# Altium schematic symbol library SCHLIB.SchLib: 2608 symbols (part 17 of 20) (continued)
## R-158K-0402 (continued)
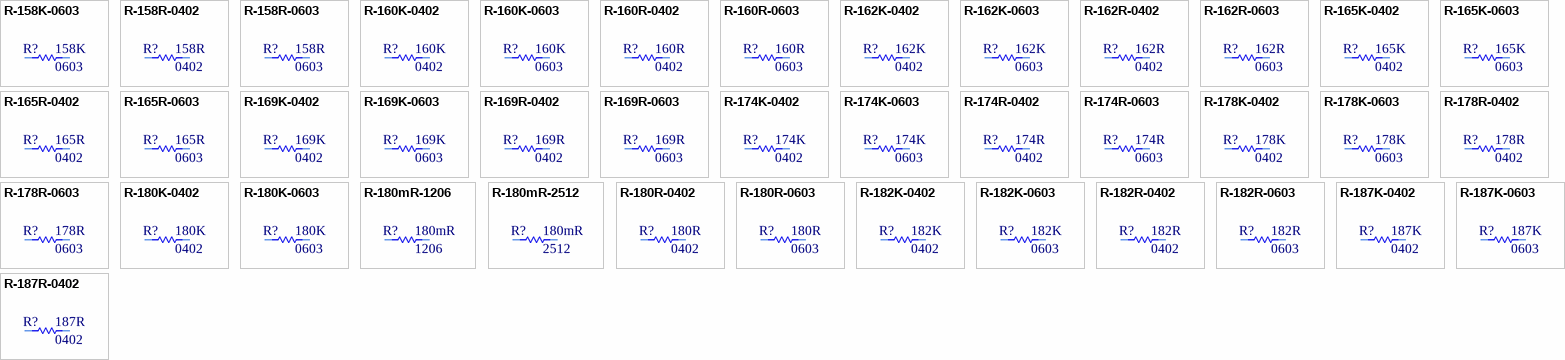
[diagram p72: symbols R-158K-0603 to R-187R-0402]

## R-158K-0603
designator R?, comment Package: 0603  (hidden comment: 158K)
RES SMD 158K OHM 1% 1/10W 0603; Manufacturer Part Number: CRCW0603158KFKEA; Manufacturer: Vishay Dale; Tolerance: 0.01; Power: 0.1W; Temperature Coefficient: ±100ppm/°C; Object  Type: Part; Design Item ID: R-158K-0603; Value: 158K; Composition: Thick Film; Features: Automotive AEC-Q200; Operating Temperature: -55°C ~ 155°C; Height - Seated (Max): 0.50mm; Category: Resistor
footprint R0603
pins: 1, 2

## R-158R-0402
designator R?, comment Package: 0402  (hidden comment: 158R)
RES 158 OHM 1% 1/16W 0402; Manufacturer Part Number: RC0402FR-07158RL; Manufacturer: YAGEO; Tolerance: 0.01; Power: 0.063W; Temperature Coefficient: ±100ppm/°C; Object  Type: Part; Design Item ID: R-158R-0402; Value: 158R; Composition: Thick Film; Features: Moisture Resistant; Operating Temperature: -55°C ~ 155°C; Height - Seated (Max): 0.40mm; Category: Resistor
footprint R0402
pins: 1, 2

## R-158R-0603
designator R?, comment Package: 0603  (hidden comment: 158R)
RES SMD 158 OHM 1% 1/10W 0603; Manufacturer Part Number: CRCW0603158RFKEA; Manufacturer: Vishay Dale; Tolerance: 0.01; Power: 0.1W; Temperature Coefficient: ±100ppm/°C; Object  Type: Part; Design Item ID: R-158R-0603; Value: 158R; Composition: Thick Film; Features: Automotive AEC-Q200; Operating Temperature: -55°C ~ 155°C; Height - Seated (Max): 0.50mm; Category: Resistor
footprint R0603
pins: 1, 2

## R-160K-0402
designator R?, comment Package: 0402  (hidden comment: 160K)
RES 160K OHM 1% 1/16W 0402; Manufacturer Part Number: RC0402FR-07160KL; Manufacturer: YAGEO; Tolerance: 0.01; Power: 0.063W; Temperature Coefficient: ±100ppm/°C; Object  Type: Part; Design Item ID: R-160K-0402; Value: 160K; Composition: Thick Film; Features: Moisture Resistant; Operating Temperature: -55°C ~ 155°C; Height - Seated (Max): 0.40mm; Category: Resistor
footprint R0402
pins: 1, 2

## R-160K-0603
designator R?, comment Package: 0603  (hidden comment: 160K)
RES SMD 160K OHM 1% 1/10W 0603; Manufacturer Part Number: CRCW0603160KFKEA; Manufacturer: Vishay Dale; Tolerance: 0.01; Power: 0.1W; Temperature Coefficient: ±100ppm/°C; Object  Type: Part; Design Item ID: R-160K-0603; Value: 160K; Composition: Thick Film; Features: Automotive AEC-Q200; Operating Temperature: -55°C ~ 155°C; Height - Seated (Max): 0.50mm; Category: Resistor
footprint R0603
pins: 1, 2

## R-160R-0402
designator R?, comment Package: 0402  (hidden comment: 160R)
RES 160 OHM 1% 1/16W 0402; Manufacturer Part Number: RC0402FR-07160RL; Manufacturer: YAGEO; Tolerance: 0.01; Power: 0.063W; Temperature Coefficient: ±100ppm/°C; Object  Type: Part; Design Item ID: R-160R-0402; Value: 160R; Composition: Thick Film; Features: Moisture Resistant; Operating Temperature: -55°C ~ 155°C; Height - Seated (Max): 0.40mm; Category: Resistor
footprint R0402
pins: 1, 2

## R-160R-0603
designator R?, comment Package: 0603  (hidden comment: 160R)
RES SMD 160 OHM 1% 1/10W 0603; Manufacturer Part Number: CRCW0603160RFKEA; Manufacturer: Vishay Dale; Tolerance: 0.01; Power: 0.1W; Temperature Coefficient: ±100ppm/°C; Object  Type: Part; Design Item ID: R-160R-0603; Value: 160R; Composition: Thick Film; Features: Automotive AEC-Q200; Operating Temperature: -55°C ~ 155°C; Height - Seated (Max): 0.50mm; Category: Resistor
footprint R0603
pins: 1, 2

## R-162K-0402
designator R?, comment Package: 0402  (hidden comment: 162K)
RES 162K OHM 1% 1/16W 0402; Manufacturer Part Number: RC0402FR-07162KL; Manufacturer: YAGEO; Tolerance: 0.01; Power: 0.063W; Temperature Coefficient: ±100ppm/°C; Object  Type: Part; Design Item ID: R-162K-0402; Value: 162K; Composition: Thick Film; Features: Moisture Resistant; Operating Temperature: -55°C ~ 155°C; Height - Seated (Max): 0.40mm; Category: Resistor
footprint R0402
pins: 1, 2

## R-162K-0603
designator R?, comment Package: 0603  (hidden comment: 162K)
RES SMD 162K OHM 1% 1/10W 0603; Manufacturer Part Number: CRCW0603162KFKEA; Manufacturer: Vishay Dale; Tolerance: 0.01; Power: 0.1W; Temperature Coefficient: ±100ppm/°C; Object  Type: Part; Design Item ID: R-162K-0603; Value: 162K; Composition: Thick Film; Features: Automotive AEC-Q200; Operating Temperature: -55°C ~ 155°C; Height - Seated (Max): 0.50mm; Category: Resistor
footprint R0603
pins: 1, 2

## R-162R-0402
designator R?, comment Package: 0402  (hidden comment: 162R)
RES 162 OHM 1% 1/16W 0402; Manufacturer Part Number: RC0402FR-07162RL; Manufacturer: YAGEO; Tolerance: 0.01; Power: 0.063W; Temperature Coefficient: ±100ppm/°C; Object  Type: Part; Design Item ID: R-162R-0402; Value: 162R; Composition: Thick Film; Features: Moisture Resistant; Operating Temperature: -55°C ~ 155°C; Height - Seated (Max): 0.40mm; Category: Resistor
footprint R0402
pins: 1, 2

## R-162R-0603
designator R?, comment Package: 0603  (hidden comment: 162R)
RES SMD 162 OHM 1% 1/10W 0603; Manufacturer Part Number: CRCW0603162RFKEA; Manufacturer: Vishay Dale; Tolerance: 0.01; Power: 0.1W; Temperature Coefficient: ±100ppm/°C; Object  Type: Part; Design Item ID: R-162R-0603; Value: 162R; Composition: Thick Film; Features: Automotive AEC-Q200; Operating Temperature: -55°C ~ 155°C; Height - Seated (Max): 0.50mm; Category: Resistor
footprint R0603
pins: 1, 2

## R-165K-0402
designator R?, comment Package: 0402  (hidden comment: 165K)
RES 165K OHM 1% 1/16W 0402; Manufacturer Part Number: RC0402FR-07165KL; Manufacturer: YAGEO; Tolerance: 0.01; Power: 0.063W; Temperature Coefficient: ±100ppm/°C; Object  Type: Part; Design Item ID: R-165K-0402; Value: 165K; Composition: Thick Film; Features: Moisture Resistant; Operating Temperature: -55°C ~ 155°C; Height - Seated (Max): 0.40mm; Category: Resistor
footprint R0402
pins: 1, 2

## R-165K-0603
designator R?, comment Package: 0603  (hidden comment: 165K)
RES SMD 165K OHM 1% 1/10W 0603; Manufacturer Part Number: CRCW0603165KFKEA; Manufacturer: Vishay Dale; Tolerance: 0.01; Power: 0.1W; Temperature Coefficient: ±100ppm/°C; Object  Type: Part; Design Item ID: R-165K-0603; Value: 165K; Composition: Thick Film; Features: Automotive AEC-Q200; Operating Temperature: -55°C ~ 155°C; Height - Seated (Max): 0.50mm; Category: Resistor
footprint R0603
pins: 1, 2

## R-165R-0402
designator R?, comment Package: 0402  (hidden comment: 165R)
RES 165 OHM 1% 1/16W 0402; Manufacturer Part Number: RC0402FR-07165RL; Manufacturer: YAGEO; Tolerance: 0.01; Power: 0.063W; Temperature Coefficient: ±100ppm/°C; Object  Type: Part; Design Item ID: R-165R-0402; Value: 165R; Composition: Thick Film; Features: Moisture Resistant; Operating Temperature: -55°C ~ 155°C; Height - Seated (Max): 0.40mm; Category: Resistor
footprint R0402
pins: 1, 2

## R-165R-0603
designator R?, comment Package: 0603  (hidden comment: 165R)
RES SMD 165 OHM 1% 1/10W 0603; Manufacturer Part Number: CRCW0603165RFKEA; Manufacturer: Vishay Dale; Tolerance: 0.01; Power: 0.1W; Temperature Coefficient: ±100ppm/°C; Object  Type: Part; Design Item ID: R-165R-0603; Value: 165R; Composition: Thick Film; Features: Automotive AEC-Q200; Operating Temperature: -55°C ~ 155°C; Height - Seated (Max): 0.50mm; Category: Resistor
footprint R0603
pins: 1, 2

## R-169K-0402
designator R?, comment Package: 0402  (hidden comment: 169K)
RES 169K OHM 1% 1/16W 0402; Manufacturer Part Number: RC0402FR-07169KL; Manufacturer: YAGEO; Tolerance: 0.01; Power: 0.063W; Temperature Coefficient: ±100ppm/°C; Object  Type: Part; Design Item ID: R-169K-0402; Value: 169K; Composition: Thick Film; Features: Moisture Resistant; Operating Temperature: -55°C ~ 155°C; Height - Seated (Max): 0.40mm; Category: Resistor
footprint R0402
pins: 1, 2

## R-169K-0603
designator R?, comment Package: 0603  (hidden comment: 169K)
RES SMD 169K OHM 1% 1/10W 0603; Manufacturer Part Number: CRCW0603169KFKEA; Manufacturer: Vishay Dale; Tolerance: 0.01; Power: 0.1W; Temperature Coefficient: ±100ppm/°C; Object  Type: Part; Design Item ID: R-169K-0603; Value: 169K; Composition: Thick Film; Features: Automotive AEC-Q200; Operating Temperature: -55°C ~ 155°C; Height - Seated (Max): 0.50mm; Category: Resistor
footprint R0603
pins: 1, 2

## R-169R-0402
designator R?, comment Package: 0402  (hidden comment: 169R)
RES 169 OHM 1% 1/16W 0402; Manufacturer Part Number: RC0402FR-07169RL; Manufacturer: YAGEO; Tolerance: 0.01; Power: 0.063W; Temperature Coefficient: ±100ppm/°C; Object  Type: Part; Design Item ID: R-169R-0402; Value: 169R; Composition: Thick Film; Features: Moisture Resistant; Operating Temperature: -55°C ~ 155°C; Height - Seated (Max): 0.40mm; Category: Resistor
footprint R0402
pins: 1, 2

## R-169R-0603
designator R?, comment Package: 0603  (hidden comment: 169R)
RES SMD 169 OHM 1% 1/10W 0603; Manufacturer Part Number: CRCW0603169RFKEA; Manufacturer: Vishay Dale; Tolerance: 0.01; Power: 0.1W; Temperature Coefficient: ±100ppm/°C; Object  Type: Part; Design Item ID: R-169R-0603; Value: 169R; Composition: Thick Film; Features: Automotive AEC-Q200; Operating Temperature: -55°C ~ 155°C; Height - Seated (Max): 0.50mm; Category: Resistor
footprint R0603
pins: 1, 2

## R-174K-0402
designator R?, comment Package: 0402  (hidden comment: 174K)
RES 174K OHM 1% 1/16W 0402; Manufacturer Part Number: RC0402FR-07174KL; Manufacturer: YAGEO; Tolerance: 0.01; Power: 0.063W; Temperature Coefficient: ±100ppm/°C; Object  Type: Part; Design Item ID: R-174K-0402; Value: 174K; Composition: Thick Film; Features: Moisture Resistant; Operating Temperature: -55°C ~ 155°C; Height - Seated (Max): 0.40mm; Category: Resistor
footprint R0402
pins: 1, 2

## R-174K-0603
designator R?, comment Package: 0603  (hidden comment: 174K)
RES SMD 174K OHM 1% 1/10W 0603; Manufacturer Part Number: CRCW0603174KFKEA; Manufacturer: Vishay Dale; Tolerance: 0.01; Power: 0.1W; Temperature Coefficient: ±100ppm/°C; Object  Type: Part; Design Item ID: R-174K-0603; Value: 174K; Composition: Thick Film; Features: Automotive AEC-Q200; Operating Temperature: -55°C ~ 155°C; Height - Seated (Max): 0.50mm; Category: Resistor
footprint R0603
pins: 1, 2

## R-174R-0402
designator R?, comment Package: 0402  (hidden comment: 174R)
RES 174 OHM 1% 1/16W 0402; Manufacturer Part Number: RC0402FR-07174RL; Manufacturer: YAGEO; Tolerance: 0.01; Power: 0.063W; Temperature Coefficient: ±100ppm/°C; Object  Type: Part; Design Item ID: R-174R-0402; Value: 174R; Composition: Thick Film; Features: Moisture Resistant; Operating Temperature: -55°C ~ 155°C; Height - Seated (Max): 0.40mm; Category: Resistor
footprint R0402
pins: 1, 2

## R-174R-0603
designator R?, comment Package: 0603  (hidden comment: 174R)
RES SMD 174 OHM 1% 1/10W 0603; Manufacturer Part Number: CRCW0603174RFKEA; Manufacturer: Vishay Dale; Tolerance: 0.01; Power: 0.1W; Temperature Coefficient: ±100ppm/°C; Object  Type: Part; Design Item ID: R-174R-0603; Value: 174R; Composition: Thick Film; Features: Automotive AEC-Q200; Operating Temperature: -55°C ~ 155°C; Height - Seated (Max): 0.50mm; Category: Resistor
footprint R0603
pins: 1, 2

## R-178K-0402
designator R?, comment Package: 0402  (hidden comment: 178K)
RES 178K OHM 1% 1/16W 0402; Manufacturer Part Number: RC0402FR-07178KL; Manufacturer: YAGEO; Tolerance: 0.01; Power: 0.063W; Temperature Coefficient: ±100ppm/°C; Object  Type: Part; Design Item ID: R-178K-0402; Value: 178K; Composition: Thick Film; Features: Moisture Resistant; Operating Temperature: -55°C ~ 155°C; Height - Seated (Max): 0.40mm; Category: Resistor
footprint R0402
pins: 1, 2

## R-178K-0603
designator R?, comment Package: 0603  (hidden comment: 178K)
RES SMD 178K OHM 1% 1/10W 0603; Manufacturer Part Number: CRCW0603178KFKEA; Manufacturer: Vishay Dale; Tolerance: 0.01; Power: 0.1W; Temperature Coefficient: ±100ppm/°C; Object  Type: Part; Design Item ID: R-178K-0603; Value: 178K; Composition: Thick Film; Features: Automotive AEC-Q200; Operating Temperature: -55°C ~ 155°C; Height - Seated (Max): 0.50mm; Category: Resistor
footprint R0603
pins: 1, 2

## R-178R-0402
designator R?, comment Package: 0402  (hidden comment: 178R)
RES 178 OHM 1% 1/16W 0402; Manufacturer Part Number: RC0402FR-07178RL; Manufacturer: YAGEO; Tolerance: 0.01; Power: 0.063W; Temperature Coefficient: ±100ppm/°C; Object  Type: Part; Design Item ID: R-178R-0402; Value: 178R; Composition: Thick Film; Features: Moisture Resistant; Operating Temperature: -55°C ~ 155°C; Height - Seated (Max): 0.40mm; Category: Resistor
footprint R0402
pins: 1, 2

## R-178R-0603
designator R?, comment Package: 0603  (hidden comment: 178R)
RES SMD 178 OHM 1% 1/10W 0603; Manufacturer Part Number: CRCW0603178RFKEA; Manufacturer: Vishay Dale; Tolerance: 0.01; Power: 0.1W; Temperature Coefficient: ±100ppm/°C; Object  Type: Part; Design Item ID: R-178R-0603; Value: 178R; Composition: Thick Film; Features: Automotive AEC-Q200; Operating Temperature: -55°C ~ 155°C; Height - Seated (Max): 0.50mm; Category: Resistor
footprint R0603
pins: 1, 2

## R-180K-0402
designator R?, comment Package: 0402  (hidden comment: 180K)
RES 180K OHM 1% 1/16W 0402; Manufacturer Part Number: RC0402FR-07180KL; Manufacturer: YAGEO; Tolerance: 0.01; Power: 0.063W; Temperature Coefficient: ±100ppm/°C; Object  Type: Part; Design Item ID: R-180K-0402; Value: 180K; Composition: Thick Film; Features: Moisture Resistant; Operating Temperature: -55°C ~ 155°C; Height - Seated (Max): 0.40mm; Category: Resistor
footprint R0402
pins: 1, 2

## R-180K-0603
designator R?, comment Package: 0603  (hidden comment: 180K)
RES SMD 180K OHM 1% 1/10W 0603; Manufacturer Part Number: CRCW0603180KFKEA; Manufacturer: Vishay Dale; Tolerance: 0.01; Power: 0.1W; Temperature Coefficient: ±100ppm/°C; Object  Type: Part; Design Item ID: R-180K-0603; Value: 180K; Composition: Thick Film; Features: Automotive AEC-Q200; Operating Temperature: -55°C ~ 155°C; Height - Seated (Max): 0.50mm; Category: Resistor
footprint R0603
pins: 1, 2

## R-180mR-1206
designator R?, comment Package: 1206  (hidden comment: 180mR)
RES 0.18 OHM 1% 1/4W 1206; Manufacturer Part Number: WSL1206R1800FEA; Manufacturer: Vishay Dale; Tolerance: 0.01; Power: 0.25W; Temperature Coefficient: ±75ppm/°C; Object  Type: Part; Design Item ID: R-180mR-1206; Value: 180mR; Composition: Metal Element; Features: Anti-Sulfur, Automotive AEC-Q200, Current Sense, Moisture Resistant, Pulse Withstanding; Operating Temperature: -65°C ~ 170°C; Height - Seated (Max): 0.89mm; Category: Resistor
footprint R1206
pins: 1, 2

## R-180mR-2512
designator R?, comment Package: 2512  (hidden comment: 180mR)
RES 0.18 OHM 1% 1W 2512; Manufacturer Part Number: WSL2512R1800FEA; Manufacturer: Vishay Dale; Tolerance: 0.01; Temperature Coefficient: ±75ppm/°C; Object  Type: Part; Design Item ID: R-180mR-2512; Value: 180mR; Power: 1W; Composition: Metal Element; Features: Anti-Sulfur, Automotive AEC-Q200, Current Sense, Moisture Resistant, Pulse Withstanding; Operating Temperature: -65°C ~ 170°C; Height - Seated (Max): 0.89mm; Category: Resistor
footprint R2512
pins: 1, 2

## R-180R-0402
designator R?, comment Package: 0402  (hidden comment: 180R)
RES 180 OHM 1% 1/16W 0402; Manufacturer Part Number: RC0402FR-07180RL; Manufacturer: YAGEO; Tolerance: 0.01; Power: 0.063W; Temperature Coefficient: ±100ppm/°C; Object  Type: Part; Design Item ID: R-180R-0402; Value: 180R; Composition: Thick Film; Features: Moisture Resistant; Operating Temperature: -55°C ~ 155°C; Height - Seated (Max): 0.40mm; Category: Resistor
footprint R0402
pins: 1, 2

## R-180R-0603
designator R?, comment Package: 0603  (hidden comment: 180R)
RES SMD 180 OHM 1% 1/10W 0603; Manufacturer Part Number: CRCW0603180RFKEA; Manufacturer: Vishay Dale; Tolerance: 0.01; Power: 0.1W; Temperature Coefficient: ±100ppm/°C; Object  Type: Part; Design Item ID: R-180R-0603; Value: 180R; Composition: Thick Film; Features: Automotive AEC-Q200; Operating Temperature: -55°C ~ 155°C; Height - Seated (Max): 0.50mm; Category: Resistor
footprint R0603
pins: 1, 2

## R-182K-0402
designator R?, comment Package: 0402  (hidden comment: 182K)
RES 182K OHM 1% 1/16W 0402; Manufacturer Part Number: RC0402FR-07182KL; Manufacturer: YAGEO; Tolerance: 0.01; Power: 0.063W; Temperature Coefficient: ±100ppm/°C; Object  Type: Part; Design Item ID: R-182K-0402; Value: 182K; Composition: Thick Film; Features: Moisture Resistant; Operating Temperature: -55°C ~ 155°C; Height - Seated (Max): 0.40mm; Category: Resistor
footprint R0402
pins: 1, 2

## R-182K-0603
designator R?, comment Package: 0603  (hidden comment: 182K)
RES SMD 182K OHM 1% 1/10W 0603; Manufacturer Part Number: CRCW0603182KFKEA; Manufacturer: Vishay Dale; Tolerance: 0.01; Power: 0.1W; Temperature Coefficient: ±100ppm/°C; Object  Type: Part; Design Item ID: R-182K-0603; Value: 182K; Composition: Thick Film; Features: Automotive AEC-Q200; Operating Temperature: -55°C ~ 155°C; Height - Seated (Max): 0.50mm; Category: Resistor
footprint R0603
pins: 1, 2

## R-182R-0402
designator R?, comment Package: 0402  (hidden comment: 182R)
RES 182 OHM 1% 1/16W 0402; Manufacturer Part Number: RC0402FR-07182RL; Manufacturer: YAGEO; Tolerance: 0.01; Power: 0.063W; Temperature Coefficient: ±100ppm/°C; Object  Type: Part; Design Item ID: R-182R-0402; Value: 182R; Composition: Thick Film; Features: Moisture Resistant; Operating Temperature: -55°C ~ 155°C; Height - Seated (Max): 0.40mm; Category: Resistor
footprint R0402
pins: 1, 2

## R-182R-0603
designator R?, comment Package: 0603  (hidden comment: 182R)
RES SMD 182 OHM 1% 1/10W 0603; Manufacturer Part Number: CRCW0603182RFKEA; Manufacturer: Vishay Dale; Tolerance: 0.01; Power: 0.1W; Temperature Coefficient: ±100ppm/°C; Object  Type: Part; Design Item ID: R-182R-0603; Value: 182R; Composition: Thick Film; Features: Automotive AEC-Q200; Operating Temperature: -55°C ~ 155°C; Height - Seated (Max): 0.50mm; Category: Resistor
footprint R0603
pins: 1, 2

## R-187K-0402
designator R?, comment Package: 0402  (hidden comment: 187K)
RES 187K OHM 1% 1/16W 0402; Manufacturer Part Number: RC0402FR-07187KL; Manufacturer: YAGEO; Tolerance: 0.01; Power: 0.063W; Temperature Coefficient: ±100ppm/°C; Object  Type: Part; Design Item ID: R-187K-0402; Value: 187K; Composition: Thick Film; Features: Moisture Resistant; Operating Temperature: -55°C ~ 155°C; Height - Seated (Max): 0.40mm; Category: Resistor
footprint R0402
pins: 1, 2

## R-187K-0603
designator R?, comment Package: 0603  (hidden comment: 187K)
RES SMD 187K OHM 1% 1/10W 0603; Manufacturer Part Number: CRCW0603187KFKEA; Manufacturer: Vishay Dale; Tolerance: 0.01; Power: 0.1W; Temperature Coefficient: ±100ppm/°C; Object  Type: Part; Design Item ID: R-187K-0603; Value: 187K; Composition: Thick Film; Features: Automotive AEC-Q200; Operating Temperature: -55°C ~ 155°C; Height - Seated (Max): 0.50mm; Category: Resistor
footprint R0603
pins: 1, 2

## R-187R-0402
designator R?, comment Package: 0402  (hidden comment: 187R)
RES 187 OHM 1% 1/16W 0402; Manufacturer Part Number: RC0402FR-07187RL; Manufacturer: YAGEO; Tolerance: 0.01; Power: 0.063W; Temperature Coefficient: ±100ppm/°C; Object  Type: Part; Design Item ID: R-187R-0402; Value: 187R; Composition: Thick Film; Features: Moisture Resistant; Operating Temperature: -55°C ~ 155°C; Height - Seated (Max): 0.40mm; Category: Resistor
footprint R0402
pins: 1, 2

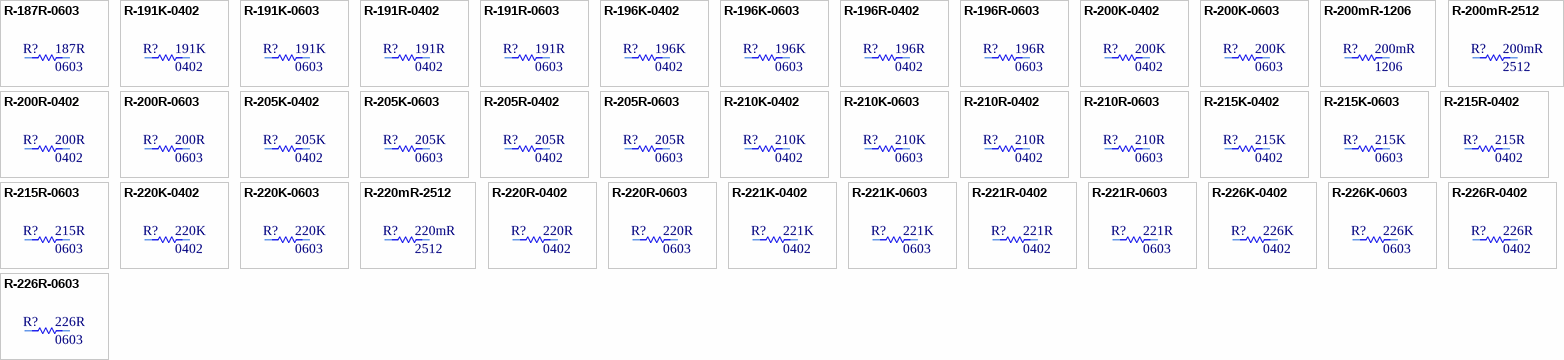
[diagram p73: symbols R-187R-0603 to R-226R-0603]

## R-187R-0603
designator R?, comment Package: 0603  (hidden comment: 187R)
RES SMD 187 OHM 1% 1/10W 0603; Manufacturer Part Number: CRCW0603187RFKEA; Manufacturer: Vishay Dale; Tolerance: 0.01; Power: 0.1W; Temperature Coefficient: ±100ppm/°C; Object  Type: Part; Design Item ID: R-187R-0603; Value: 187R; Composition: Thick Film; Features: Automotive AEC-Q200; Operating Temperature: -55°C ~ 155°C; Height - Seated (Max): 0.50mm; Category: Resistor
footprint R0603
pins: 1, 2

## R-191K-0402
designator R?, comment Package: 0402  (hidden comment: 191K)
RES 191K OHM 1% 1/16W 0402; Manufacturer Part Number: RC0402FR-07191KL; Manufacturer: YAGEO; Tolerance: 0.01; Power: 0.063W; Temperature Coefficient: ±100ppm/°C; Object  Type: Part; Design Item ID: R-191K-0402; Value: 191K; Composition: Thick Film; Features: Moisture Resistant; Operating Temperature: -55°C ~ 155°C; Height - Seated (Max): 0.40mm; Category: Resistor
footprint R0402
pins: 1, 2

## R-191K-0603
designator R?, comment Package: 0603  (hidden comment: 191K)
RES SMD 191K OHM 1% 1/10W 0603; Manufacturer Part Number: CRCW0603191KFKEA; Manufacturer: Vishay Dale; Tolerance: 0.01; Power: 0.1W; Temperature Coefficient: ±100ppm/°C; Object  Type: Part; Design Item ID: R-191K-0603; Value: 191K; Composition: Thick Film; Features: Automotive AEC-Q200; Operating Temperature: -55°C ~ 155°C; Height - Seated (Max): 0.50mm; Category: Resistor
footprint R0603
pins: 1, 2

## R-191R-0402
designator R?, comment Package: 0402  (hidden comment: 191R)
RES 191 OHM 1% 1/16W 0402; Manufacturer Part Number: RC0402FR-07191RL; Manufacturer: YAGEO; Tolerance: 0.01; Power: 0.063W; Temperature Coefficient: ±100ppm/°C; Object  Type: Part; Design Item ID: R-191R-0402; Value: 191R; Composition: Thick Film; Features: Moisture Resistant; Operating Temperature: -55°C ~ 155°C; Height - Seated (Max): 0.40mm; Category: Resistor
footprint R0402
pins: 1, 2

## R-191R-0603
designator R?, comment Package: 0603  (hidden comment: 191R)
RES SMD 191 OHM 1% 1/10W 0603; Manufacturer Part Number: CRCW0603191RFKEA; Manufacturer: Vishay Dale; Tolerance: 0.01; Power: 0.1W; Temperature Coefficient: ±100ppm/°C; Object  Type: Part; Design Item ID: R-191R-0603; Value: 191R; Composition: Thick Film; Features: Automotive AEC-Q200; Operating Temperature: -55°C ~ 155°C; Height - Seated (Max): 0.50mm; Category: Resistor
footprint R0603
pins: 1, 2

## R-196K-0402
designator R?, comment Package: 0402  (hidden comment: 196K)
RES 196K OHM 1% 1/16W 0402; Manufacturer Part Number: RC0402FR-07196KL; Manufacturer: YAGEO; Tolerance: 0.01; Power: 0.063W; Temperature Coefficient: ±100ppm/°C; Object  Type: Part; Design Item ID: R-196K-0402; Value: 196K; Composition: Thick Film; Features: Moisture Resistant; Operating Temperature: -55°C ~ 155°C; Height - Seated (Max): 0.40mm; Category: Resistor
footprint R0402
pins: 1, 2

## R-196K-0603
designator R?, comment Package: 0603  (hidden comment: 196K)
RES SMD 196K OHM 1% 1/10W 0603; Manufacturer Part Number: CRCW0603196KFKEA; Manufacturer: Vishay Dale; Tolerance: 0.01; Power: 0.1W; Temperature Coefficient: ±100ppm/°C; Object  Type: Part; Design Item ID: R-196K-0603; Value: 196K; Composition: Thick Film; Features: Automotive AEC-Q200; Operating Temperature: -55°C ~ 155°C; Height - Seated (Max): 0.50mm; Category: Resistor
footprint R0603
pins: 1, 2

## R-196R-0402
designator R?, comment Package: 0402  (hidden comment: 196R)
RES 196 OHM 1% 1/16W 0402; Manufacturer Part Number: RC0402FR-07196RL; Manufacturer: YAGEO; Tolerance: 0.01; Power: 0.063W; Temperature Coefficient: ±100ppm/°C; Object  Type: Part; Design Item ID: R-196R-0402; Value: 196R; Composition: Thick Film; Features: Moisture Resistant; Operating Temperature: -55°C ~ 155°C; Height - Seated (Max): 0.40mm; Category: Resistor
footprint R0402
pins: 1, 2

## R-196R-0603
designator R?, comment Package: 0603  (hidden comment: 196R)
RES SMD 196 OHM 1% 1/10W 0603; Manufacturer Part Number: CRCW0603196RFKEA; Manufacturer: Vishay Dale; Tolerance: 0.01; Power: 0.1W; Temperature Coefficient: ±100ppm/°C; Object  Type: Part; Design Item ID: R-196R-0603; Value: 196R; Composition: Thick Film; Features: Automotive AEC-Q200; Operating Temperature: -55°C ~ 155°C; Height - Seated (Max): 0.50mm; Category: Resistor
footprint R0603
pins: 1, 2

## R-200K-0402
designator R?, comment Package: 0402  (hidden comment: 200K)
RES 200K OHM 1% 1/16W 0402; Manufacturer Part Number: RC0402FR-07200KL; Manufacturer: YAGEO; Tolerance: 0.01; Power: 0.063W; Temperature Coefficient: ±100ppm/°C; Object  Type: Part; Design Item ID: R-200K-0402; Value: 200K; Composition: Thick Film; Features: Moisture Resistant; Operating Temperature: -55°C ~ 155°C; Height - Seated (Max): 0.40mm; Category: Resistor
footprint R0402
pins: 1, 2

## R-200K-0603
designator R?, comment Package: 0603  (hidden comment: 200K)
RES SMD 200K OHM 1% 1/10W 0603; Manufacturer Part Number: CRCW0603200KFKEA; Manufacturer: Vishay Dale; Tolerance: 0.01; Power: 0.1W; Temperature Coefficient: ±100ppm/°C; Object  Type: Part; Design Item ID: R-200K-0603; Value: 200K; Composition: Thick Film; Features: Automotive AEC-Q200; Operating Temperature: -55°C ~ 155°C; Height - Seated (Max): 0.50mm; Category: Resistor
footprint R0603
pins: 1, 2

## R-200mR-1206
designator R?, comment Package: 1206  (hidden comment: 200mR)
RES 0.2 OHM 1% 1/4W 1206; Manufacturer Part Number: WSL1206R2000FEA; Manufacturer: Vishay Dale; Tolerance: 0.01; Power: 0.25W; Temperature Coefficient: ±75ppm/°C; Object  Type: Part; Design Item ID: R-200mR-1206; Value: 200mR; Composition: Metal Element; Features: Anti-Sulfur, Automotive AEC-Q200, Current Sense, Moisture Resistant, Pulse Withstanding; Operating Temperature: -65°C ~ 170°C; Height - Seated (Max): 0.89mm; Category: Resistor
footprint R1206
pins: 1, 2

## R-200mR-2512
designator R?, comment Package: 2512  (hidden comment: 200mR)
RES 0.2 OHM 1% 1W 2512; Manufacturer Part Number: WSL2512R2000FEA; Manufacturer: Vishay Dale; Tolerance: 0.01; Temperature Coefficient: ±75ppm/°C; Object  Type: Part; Design Item ID: R-200mR-2512; Value: 200mR; Power: 1W; Composition: Metal Element; Features: Anti-Sulfur, Automotive AEC-Q200, Current Sense, Moisture Resistant, Pulse Withstanding; Operating Temperature: -65°C ~ 170°C; Height - Seated (Max): 0.89mm; Category: Resistor
footprint R2512
pins: 1, 2

## R-200R-0402
designator R?, comment Package: 0402  (hidden comment: 200R)
RES 200 OHM 1% 1/16W 0402; Manufacturer Part Number: RC0402FR-07200RL; Manufacturer: YAGEO; Tolerance: 0.01; Power: 0.063W; Temperature Coefficient: ±100ppm/°C; Object  Type: Part; Design Item ID: R-200R-0402; Value: 200R; Composition: Thick Film; Features: Moisture Resistant; Operating Temperature: -55°C ~ 155°C; Height - Seated (Max): 0.40mm; Category: Resistor
footprint R0402
pins: 1, 2

## R-200R-0603
designator R?, comment Package: 0603  (hidden comment: 200R)
RES SMD 200 OHM 1% 1/10W 0603; Manufacturer Part Number: CRCW0603200RFKEA; Manufacturer: Vishay Dale; Tolerance: 0.01; Power: 0.1W; Temperature Coefficient: ±100ppm/°C; Object  Type: Part; Design Item ID: R-200R-0603; Value: 200R; Composition: Thick Film; Features: Automotive AEC-Q200; Operating Temperature: -55°C ~ 155°C; Height - Seated (Max): 0.50mm; Category: Resistor
footprint R0603
pins: 1, 2

## R-205K-0402
designator R?, comment Package: 0402  (hidden comment: 205K)
RES 205K OHM 1% 1/16W 0402; Manufacturer Part Number: RC0402FR-07205KL; Manufacturer: YAGEO; Tolerance: 0.01; Power: 0.063W; Temperature Coefficient: ±100ppm/°C; Object  Type: Part; Design Item ID: R-205K-0402; Value: 205K; Composition: Thick Film; Features: Moisture Resistant; Operating Temperature: -55°C ~ 155°C; Height - Seated (Max): 0.40mm; Category: Resistor
footprint R0402
pins: 1, 2

## R-205K-0603
designator R?, comment Package: 0603  (hidden comment: 205K)
RES SMD 205K OHM 1% 1/10W 0603; Manufacturer Part Number: CRCW0603205KFKEA; Manufacturer: Vishay Dale; Tolerance: 0.01; Power: 0.1W; Temperature Coefficient: ±100ppm/°C; Object  Type: Part; Design Item ID: R-205K-0603; Value: 205K; Composition: Thick Film; Features: Automotive AEC-Q200; Operating Temperature: -55°C ~ 155°C; Height - Seated (Max): 0.50mm; Category: Resistor
footprint R0603
pins: 1, 2

## R-205R-0402
designator R?, comment Package: 0402  (hidden comment: 205R)
RES 205 OHM 1% 1/16W 0402; Manufacturer Part Number: RC0402FR-07205RL; Manufacturer: YAGEO; Tolerance: 0.01; Power: 0.063W; Temperature Coefficient: ±100ppm/°C; Object  Type: Part; Design Item ID: R-205R-0402; Value: 205R; Composition: Thick Film; Features: Moisture Resistant; Operating Temperature: -55°C ~ 155°C; Height - Seated (Max): 0.40mm; Category: Resistor
footprint R0402
pins: 1, 2

## R-205R-0603
designator R?, comment Package: 0603  (hidden comment: 205R)
RES SMD 205 OHM 1% 1/10W 0603; Manufacturer Part Number: CRCW0603205RFKEA; Manufacturer: Vishay Dale; Tolerance: 0.01; Power: 0.1W; Temperature Coefficient: ±100ppm/°C; Object  Type: Part; Design Item ID: R-205R-0603; Value: 205R; Composition: Thick Film; Features: Automotive AEC-Q200; Operating Temperature: -55°C ~ 155°C; Height - Seated (Max): 0.50mm; Category: Resistor
footprint R0603
pins: 1, 2

## R-210K-0402
designator R?, comment Package: 0402  (hidden comment: 210K)
RES 210K OHM 1% 1/16W 0402; Manufacturer Part Number: RC0402FR-07210KL; Manufacturer: YAGEO; Tolerance: 0.01; Power: 0.063W; Temperature Coefficient: ±100ppm/°C; Object  Type: Part; Design Item ID: R-210K-0402; Value: 210K; Composition: Thick Film; Features: Moisture Resistant; Operating Temperature: -55°C ~ 155°C; Height - Seated (Max): 0.40mm; Category: Resistor
footprint R0402
pins: 1, 2

## R-210K-0603
designator R?, comment Package: 0603  (hidden comment: 210K)
RES SMD 210K OHM 1% 1/10W 0603; Manufacturer Part Number: CRCW0603210KFKEA; Manufacturer: Vishay Dale; Tolerance: 0.01; Power: 0.1W; Temperature Coefficient: ±100ppm/°C; Object  Type: Part; Design Item ID: R-210K-0603; Value: 210K; Composition: Thick Film; Features: Automotive AEC-Q200; Operating Temperature: -55°C ~ 155°C; Height - Seated (Max): 0.50mm; Category: Resistor
footprint R0603
pins: 1, 2

## R-210R-0402
designator R?, comment Package: 0402  (hidden comment: 210R)
RES 210 OHM 1% 1/16W 0402; Manufacturer Part Number: RC0402FR-07210RL; Manufacturer: YAGEO; Tolerance: 0.01; Power: 0.063W; Temperature Coefficient: ±100ppm/°C; Object  Type: Part; Design Item ID: R-210R-0402; Value: 210R; Composition: Thick Film; Features: Moisture Resistant; Operating Temperature: -55°C ~ 155°C; Height - Seated (Max): 0.40mm; Category: Resistor
footprint R0402
pins: 1, 2

## R-210R-0603
designator R?, comment Package: 0603  (hidden comment: 210R)
RES SMD 210 OHM 1% 1/10W 0603; Manufacturer Part Number: CRCW0603210RFKEA; Manufacturer: Vishay Dale; Tolerance: 0.01; Power: 0.1W; Temperature Coefficient: ±100ppm/°C; Object  Type: Part; Design Item ID: R-210R-0603; Value: 210R; Composition: Thick Film; Features: Automotive AEC-Q200; Operating Temperature: -55°C ~ 155°C; Height - Seated (Max): 0.50mm; Category: Resistor
footprint R0603
pins: 1, 2

## R-215K-0402
designator R?, comment Package: 0402  (hidden comment: 215K)
RES 215K OHM 1% 1/16W 0402; Manufacturer Part Number: RC0402FR-07215KL; Manufacturer: YAGEO; Tolerance: 0.01; Power: 0.063W; Temperature Coefficient: ±100ppm/°C; Object  Type: Part; Design Item ID: R-215K-0402; Value: 215K; Composition: Thick Film; Features: Moisture Resistant; Operating Temperature: -55°C ~ 155°C; Height - Seated (Max): 0.40mm; Category: Resistor
footprint R0402
pins: 1, 2

## R-215K-0603
designator R?, comment Package: 0603  (hidden comment: 215K)
RES SMD 215K OHM 1% 1/10W 0603; Manufacturer Part Number: CRCW0603215KFKEA; Manufacturer: Vishay Dale; Tolerance: 0.01; Power: 0.1W; Temperature Coefficient: ±100ppm/°C; Object  Type: Part; Design Item ID: R-215K-0603; Value: 215K; Composition: Thick Film; Features: Automotive AEC-Q200; Operating Temperature: -55°C ~ 155°C; Height - Seated (Max): 0.50mm; Category: Resistor
footprint R0603
pins: 1, 2

## R-215R-0402
designator R?, comment Package: 0402  (hidden comment: 215R)
RES 215 OHM 1% 1/16W 0402; Manufacturer Part Number: RC0402FR-07215RL; Manufacturer: YAGEO; Tolerance: 0.01; Power: 0.063W; Temperature Coefficient: ±100ppm/°C; Object  Type: Part; Design Item ID: R-215R-0402; Value: 215R; Composition: Thick Film; Features: Moisture Resistant; Operating Temperature: -55°C ~ 155°C; Height - Seated (Max): 0.40mm; Category: Resistor
footprint R0402
pins: 1, 2

## R-215R-0603
designator R?, comment Package: 0603  (hidden comment: 215R)
RES SMD 215 OHM 1% 1/10W 0603; Manufacturer Part Number: CRCW0603215RFKEA; Manufacturer: Vishay Dale; Tolerance: 0.01; Power: 0.1W; Temperature Coefficient: ±100ppm/°C; Object  Type: Part; Design Item ID: R-215R-0603; Value: 215R; Composition: Thick Film; Features: Automotive AEC-Q200; Operating Temperature: -55°C ~ 155°C; Height - Seated (Max): 0.50mm; Category: Resistor
footprint R0603
pins: 1, 2

## R-220K-0402
designator R?, comment Package: 0402  (hidden comment: 220K)
RES 220K OHM 1% 1/16W 0402; Manufacturer Part Number: RC0402FR-07220KL; Manufacturer: YAGEO; Tolerance: 0.01; Power: 0.063W; Temperature Coefficient: ±100ppm/°C; Object  Type: Part; Design Item ID: R-220K-0402; Value: 220K; Composition: Thick Film; Features: Moisture Resistant; Operating Temperature: -55°C ~ 155°C; Height - Seated (Max): 0.40mm; Category: Resistor
footprint R0402
pins: 1, 2

## R-220K-0603
designator R?, comment Package: 0603  (hidden comment: 220K)
RES SMD 220K OHM 1% 1/10W 0603; Manufacturer Part Number: CRCW0603220KFKEA; Manufacturer: Vishay Dale; Tolerance: 0.01; Power: 0.1W; Temperature Coefficient: ±100ppm/°C; Object  Type: Part; Design Item ID: R-220K-0603; Value: 220K; Composition: Thick Film; Features: Automotive AEC-Q200; Operating Temperature: -55°C ~ 155°C; Height - Seated (Max): 0.50mm; Category: Resistor
footprint R0603
pins: 1, 2

## R-220mR-2512
designator R?, comment Package: 2512  (hidden comment: 220mR)
RES 0.22 OHM 1% 1W 2512; Manufacturer Part Number: WSL2512R2200FEA; Manufacturer: Vishay Dale; Tolerance: 0.01; Temperature Coefficient: ±75ppm/°C; Object  Type: Part; Design Item ID: R-220mR-2512; Value: 220mR; Power: 1W; Composition: Metal Element; Features: Anti-Sulfur, Automotive AEC-Q200, Current Sense, Moisture Resistant, Pulse Withstanding; Operating Temperature: -65°C ~ 170°C; Height - Seated (Max): 0.89mm; Category: Resistor
footprint R2512
pins: 1, 2

## R-220R-0402
designator R?, comment Package: 0402  (hidden comment: 220R)
RES 220 OHM 1% 1/16W 0402; Manufacturer Part Number: RC0402FR-07220RL; Manufacturer: YAGEO; Tolerance: 0.01; Power: 0.063W; Temperature Coefficient: ±100ppm/°C; Object  Type: Part; Design Item ID: R-220R-0402; Value: 220R; Composition: Thick Film; Features: Moisture Resistant; Operating Temperature: -55°C ~ 155°C; Height - Seated (Max): 0.40mm; Category: Resistor
footprint R0402
pins: 1, 2

## R-220R-0603
designator R?, comment Package: 0603  (hidden comment: 220R)
RES SMD 220 OHM 1% 1/10W 0603; Manufacturer Part Number: CRCW0603220RFKEA; Manufacturer: Vishay Dale; Tolerance: 0.01; Power: 0.1W; Temperature Coefficient: ±100ppm/°C; Object  Type: Part; Design Item ID: R-220R-0603; Value: 220R; Composition: Thick Film; Features: Automotive AEC-Q200; Operating Temperature: -55°C ~ 155°C; Height - Seated (Max): 0.50mm; Category: Resistor
footprint R0603
pins: 1, 2

## R-221K-0402
designator R?, comment Package: 0402  (hidden comment: 221K)
RES 221K OHM 1% 1/16W 0402; Manufacturer Part Number: RC0402FR-07221KL; Manufacturer: YAGEO; Tolerance: 0.01; Power: 0.063W; Temperature Coefficient: ±100ppm/°C; Object  Type: Part; Design Item ID: R-221K-0402; Value: 221K; Composition: Thick Film; Features: Moisture Resistant; Operating Temperature: -55°C ~ 155°C; Height - Seated (Max): 0.40mm; Category: Resistor
footprint R0402
pins: 1, 2

## R-221K-0603
designator R?, comment Package: 0603  (hidden comment: 221K)
RES SMD 221K OHM 1% 1/10W 0603; Manufacturer Part Number: CRCW0603221KFKEA; Manufacturer: Vishay Dale; Tolerance: 0.01; Power: 0.1W; Temperature Coefficient: ±100ppm/°C; Object  Type: Part; Design Item ID: R-221K-0603; Value: 221K; Composition: Thick Film; Features: Automotive AEC-Q200; Operating Temperature: -55°C ~ 155°C; Height - Seated (Max): 0.50mm; Category: Resistor
footprint R0603
pins: 1, 2

## R-221R-0402
designator R?, comment Package: 0402  (hidden comment: 221R)
RES 221 OHM 1% 1/16W 0402; Manufacturer Part Number: RC0402FR-07221RL; Manufacturer: YAGEO; Tolerance: 0.01; Power: 0.063W; Temperature Coefficient: ±100ppm/°C; Object  Type: Part; Design Item ID: R-221R-0402; Value: 221R; Composition: Thick Film; Features: Moisture Resistant; Operating Temperature: -55°C ~ 155°C; Height - Seated (Max): 0.40mm; Category: Resistor
footprint R0402
pins: 1, 2

## R-221R-0603
designator R?, comment Package: 0603  (hidden comment: 221R)
RES SMD 221 OHM 1% 1/10W 0603; Manufacturer Part Number: CRCW0603221RFKEA; Manufacturer: Vishay Dale; Tolerance: 0.01; Power: 0.1W; Temperature Coefficient: ±100ppm/°C; Object  Type: Part; Design Item ID: R-221R-0603; Value: 221R; Composition: Thick Film; Features: Automotive AEC-Q200; Operating Temperature: -55°C ~ 155°C; Height - Seated (Max): 0.50mm; Category: Resistor
footprint R0603
pins: 1, 2

## R-226K-0402
designator R?, comment Package: 0402  (hidden comment: 226K)
RES 226K OHM 1% 1/16W 0402; Manufacturer Part Number: RC0402FR-07226KL; Manufacturer: YAGEO; Tolerance: 0.01; Power: 0.063W; Temperature Coefficient: ±100ppm/°C; Object  Type: Part; Design Item ID: R-226K-0402; Value: 226K; Composition: Thick Film; Features: Moisture Resistant; Operating Temperature: -55°C ~ 155°C; Height - Seated (Max): 0.40mm; Category: Resistor
footprint R0402
pins: 1, 2

## R-226K-0603
designator R?, comment Package: 0603  (hidden comment: 226K)
RES SMD 226K OHM 1% 1/10W 0603; Manufacturer Part Number: CRCW0603226KFKEA; Manufacturer: Vishay Dale; Tolerance: 0.01; Power: 0.1W; Temperature Coefficient: ±100ppm/°C; Object  Type: Part; Design Item ID: R-226K-0603; Value: 226K; Composition: Thick Film; Features: Automotive AEC-Q200; Operating Temperature: -55°C ~ 155°C; Height - Seated (Max): 0.50mm; Category: Resistor
footprint R0603
pins: 1, 2

## R-226R-0402
designator R?, comment Package: 0402  (hidden comment: 226R)
RES 226 OHM 1% 1/16W 0402; Manufacturer Part Number: RC0402FR-07226RL; Manufacturer: YAGEO; Tolerance: 0.01; Power: 0.063W; Temperature Coefficient: ±100ppm/°C; Object  Type: Part; Design Item ID: R-226R-0402; Value: 226R; Composition: Thick Film; Features: Moisture Resistant; Operating Temperature: -55°C ~ 155°C; Height - Seated (Max): 0.40mm; Category: Resistor
footprint R0402
pins: 1, 2

## R-226R-0603
designator R?, comment Package: 0603  (hidden comment: 226R)
RES SMD 226 OHM 1% 1/10W 0603; Manufacturer Part Number: CRCW0603226RFKEA; Manufacturer: Vishay Dale; Tolerance: 0.01; Power: 0.1W; Temperature Coefficient: ±100ppm/°C; Object  Type: Part; Design Item ID: R-226R-0603; Value: 226R; Composition: Thick Film; Features: Automotive AEC-Q200; Operating Temperature: -55°C ~ 155°C; Height - Seated (Max): 0.50mm; Category: Resistor
footprint R0603
pins: 1, 2

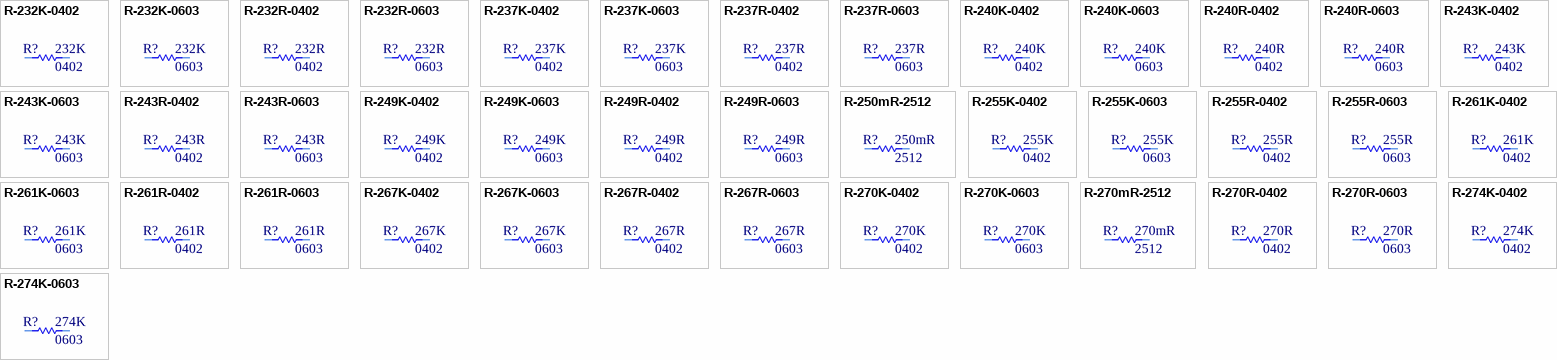
[diagram p74: symbols R-232K-0402 to R-274K-0603]

## R-232K-0402
designator R?, comment Package: 0402  (hidden comment: 232K)
RES 232K OHM 1% 1/16W 0402; Manufacturer Part Number: RC0402FR-07232KL; Manufacturer: YAGEO; Tolerance: 0.01; Power: 0.063W; Temperature Coefficient: ±100ppm/°C; Object  Type: Part; Design Item ID: R-232K-0402; Value: 232K; Composition: Thick Film; Features: Moisture Resistant; Operating Temperature: -55°C ~ 155°C; Height - Seated (Max): 0.40mm; Category: Resistor
footprint R0402
pins: 1, 2

## R-232K-0603
designator R?, comment Package: 0603  (hidden comment: 232K)
RES SMD 232K OHM 1% 1/10W 0603; Manufacturer Part Number: CRCW0603232KFKEA; Manufacturer: Vishay Dale; Tolerance: 0.01; Power: 0.1W; Temperature Coefficient: ±100ppm/°C; Object  Type: Part; Design Item ID: R-232K-0603; Value: 232K; Composition: Thick Film; Features: Automotive AEC-Q200; Operating Temperature: -55°C ~ 155°C; Height - Seated (Max): 0.50mm; Category: Resistor
footprint R0603
pins: 1, 2

## R-232R-0402
designator R?, comment Package: 0402  (hidden comment: 232R)
RES 232 OHM 1% 1/16W 0402; Manufacturer Part Number: RC0402FR-07232RL; Manufacturer: YAGEO; Tolerance: 0.01; Power: 0.063W; Temperature Coefficient: ±100ppm/°C; Object  Type: Part; Design Item ID: R-232R-0402; Value: 232R; Composition: Thick Film; Features: Moisture Resistant; Operating Temperature: -55°C ~ 155°C; Height - Seated (Max): 0.40mm; Category: Resistor
footprint R0402
pins: 1, 2

## R-232R-0603
designator R?, comment Package: 0603  (hidden comment: 232R)
RES SMD 232 OHM 1% 1/10W 0603; Manufacturer Part Number: CRCW0603232RFKEA; Manufacturer: Vishay Dale; Tolerance: 0.01; Power: 0.1W; Temperature Coefficient: ±100ppm/°C; Object  Type: Part; Design Item ID: R-232R-0603; Value: 232R; Composition: Thick Film; Features: Automotive AEC-Q200; Operating Temperature: -55°C ~ 155°C; Height - Seated (Max): 0.50mm; Category: Resistor
footprint R0603
pins: 1, 2

## R-237K-0402
designator R?, comment Package: 0402  (hidden comment: 237K)
RES 237K OHM 1% 1/16W 0402; Manufacturer Part Number: RC0402FR-07237KL; Manufacturer: YAGEO; Tolerance: 0.01; Power: 0.063W; Temperature Coefficient: ±100ppm/°C; Object  Type: Part; Design Item ID: R-237K-0402; Value: 237K; Composition: Thick Film; Features: Moisture Resistant; Operating Temperature: -55°C ~ 155°C; Height - Seated (Max): 0.40mm; Category: Resistor
footprint R0402
pins: 1, 2

## R-237K-0603
designator R?, comment Package: 0603  (hidden comment: 237K)
RES SMD 237K OHM 1% 1/10W 0603; Manufacturer Part Number: CRCW0603237KFKEA; Manufacturer: Vishay Dale; Tolerance: 0.01; Power: 0.1W; Temperature Coefficient: ±100ppm/°C; Object  Type: Part; Design Item ID: R-237K-0603; Value: 237K; Composition: Thick Film; Features: Automotive AEC-Q200; Operating Temperature: -55°C ~ 155°C; Height - Seated (Max): 0.50mm; Category: Resistor
footprint R0603
pins: 1, 2

## R-237R-0402
designator R?, comment Package: 0402  (hidden comment: 237R)
RES 237 OHM 1% 1/16W 0402; Manufacturer Part Number: RC0402FR-07237RL; Manufacturer: YAGEO; Tolerance: 0.01; Power: 0.063W; Temperature Coefficient: ±100ppm/°C; Object  Type: Part; Design Item ID: R-237R-0402; Value: 237R; Composition: Thick Film; Features: Moisture Resistant; Operating Temperature: -55°C ~ 155°C; Height - Seated (Max): 0.40mm; Category: Resistor
footprint R0402
pins: 1, 2

## R-237R-0603
designator R?, comment Package: 0603  (hidden comment: 237R)
RES SMD 237 OHM 1% 1/10W 0603; Manufacturer Part Number: CRCW0603237RFKEA; Manufacturer: Vishay Dale; Tolerance: 0.01; Power: 0.1W; Temperature Coefficient: ±100ppm/°C; Object  Type: Part; Design Item ID: R-237R-0603; Value: 237R; Composition: Thick Film; Features: Automotive AEC-Q200; Operating Temperature: -55°C ~ 155°C; Height - Seated (Max): 0.50mm; Category: Resistor
footprint R0603
pins: 1, 2